# Altium footprint library THU.PcbLib: 477 footprints (part 17 of 30)
Each footprint in its own frame and in the unit in brackets; x right, y up, seen from the top. Pads: shape width x height; smd on the part's side, far side on the other; paste and mask are expansions set on the pad; w line width, h text height; cw(c..) or ccw(c..) is an arc to the next point about the centre after c.
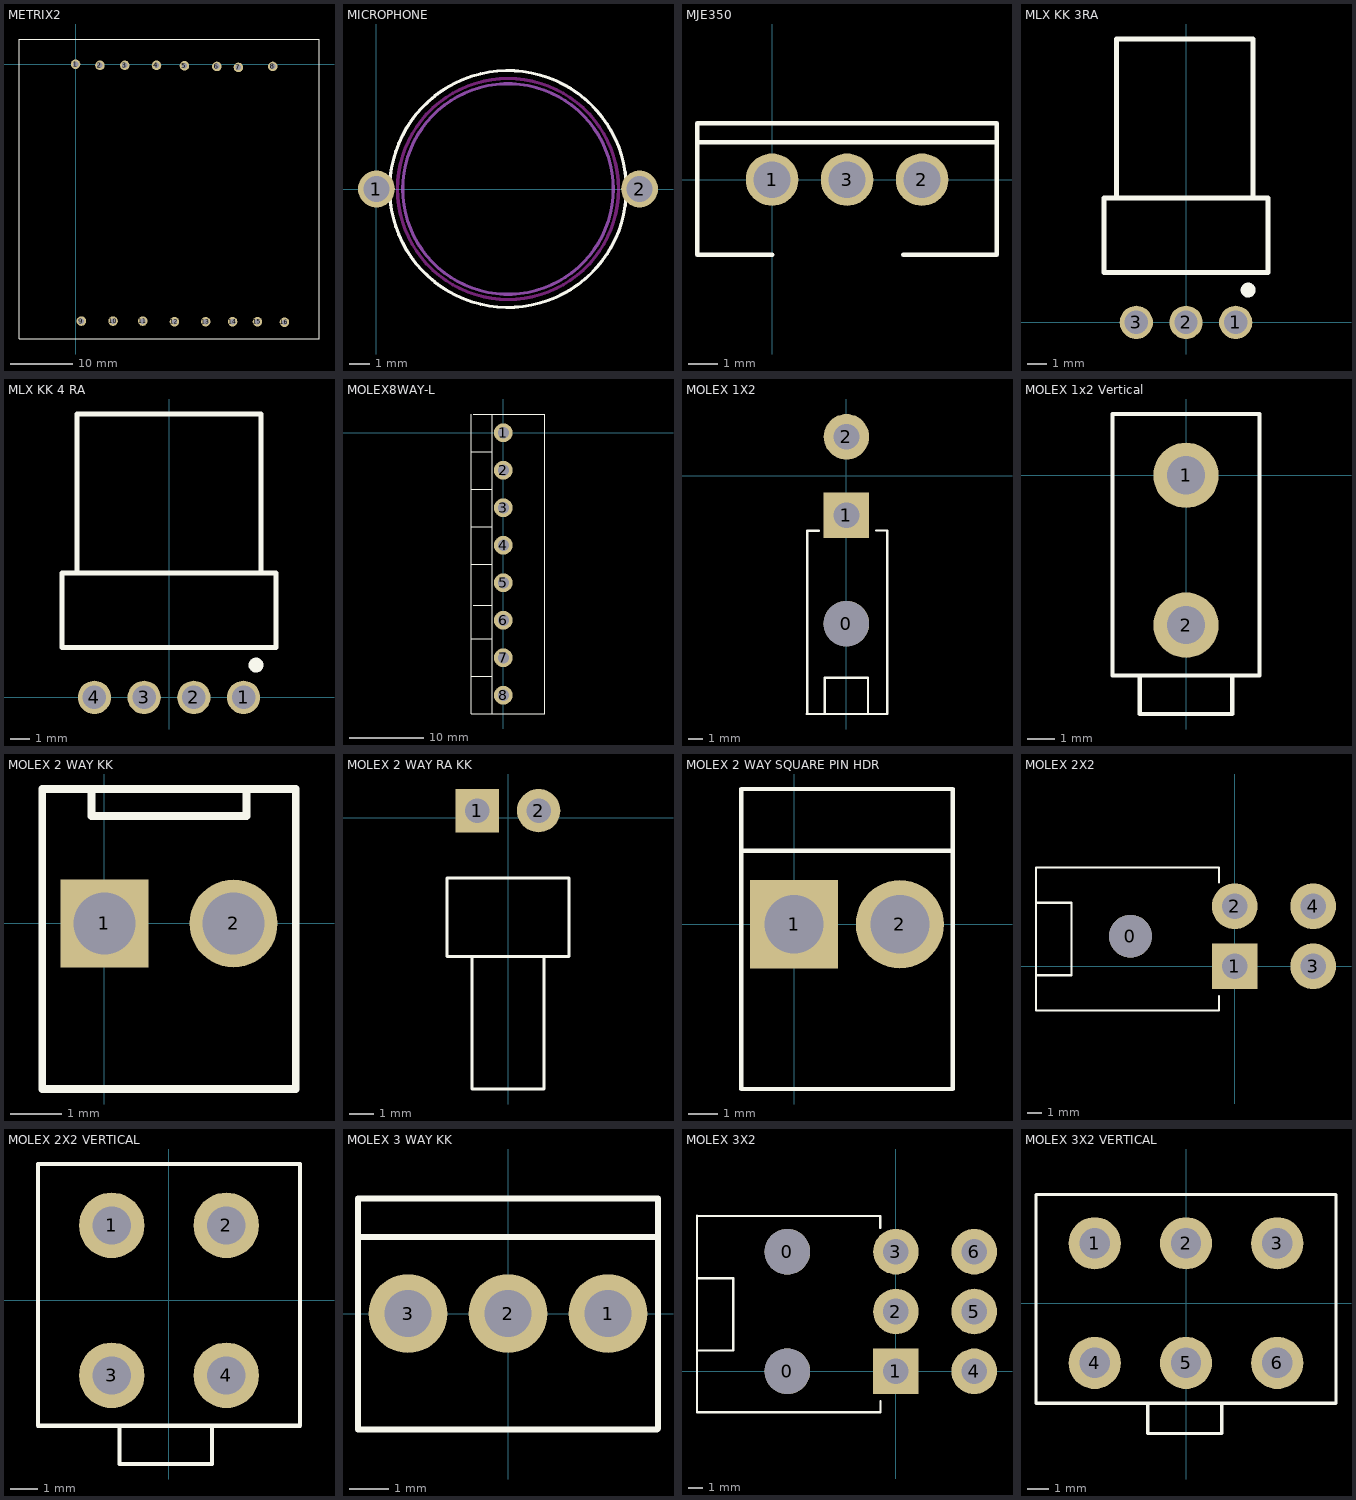
[diagram p16: the footprints below, top view; thin cyan lines are the x and y axes]

## METRIX2 [mil]
pads (16):
  round 60 hole 34: 1(0,0) 2(153.54,-6.89) 3(310.04,-6.89) 4(509.84,-6.89) 5(686.02,-9.84) 6(889.76,-13.78) 7(1025.59,-19.68) 8(1242.13,-13.78) 9(36.42,-1618.11) 10(236.22,-1618.11) 11(423.23,-1618.11) 12(623.03,-1622.05) 13(819.88,-1622.05) 14(989.17,-1622.05) 15(1145.67,-1622.05) 16(1315.94,-1625)
TopOverlay:
  lines w6: -356.3,-1729.33 1533.46,-1729.33 1533.46,157.48 -356.3,157.48 -356.3,-1729.33

## MICROPHONE [mil]
pads (2):
  round 70 hole 49: 1(0,0) 2(500,0)
TopOverlay:
  circle w6: c250,0 r225
KeepOutLayer:
  circle w6: c250,0 r210
Mechanical3:
  circle w6: c250,0 r200

## MJE350 [mil]
pads (3):
  round 70 hole 49: 1(0,0) 2(200,0) 3(100,0)
TopOverlay:
  lines w6: 0,-100 -100,-100 -100,50 ; 150,50 175,50 ; 175,-100 300,-100 300,50 ; -100,50 -100,75 300,75 300,50 ; -100,50 300,50

## MLX KK 3RA [mm]
pads (3):
  round 1.7 hole 1.2: 1(2.54,0) 2(0,0) 3(-2.54,0)
TopOverlay:
  circle w0.254: c3.175,1.651 r0.127
  circle w0.254: c3.175,1.651 r0.254
  lines w0.254: -3.556,6.35 -3.556,14.478 3.429,14.478 3.429,6.35 ; -4.191,2.54 4.191,2.54 4.191,6.35 -4.191,6.35 -4.191,2.54
3D body "022057038 3 PIN RA MOLEX.stp": height 5.87, standoff -3.77, extent -3.81,-0.307 3.81,14.431

## MLX KK 4 RA [mm]
pads (4):
  round 1.7 hole 1.2: 1(3.81,0) 2(1.27,0) 3(-1.27,0) 4(-3.81,0)
TopOverlay:
  circle w0.254: c4.445,1.651 r0.254
  circle w0.254: c4.445,1.651 r0.127
  lines w0.254: -4.699,6.35 -4.699,14.478 4.699,14.478 4.699,6.35 ; -5.461,2.54 -5.461,6.35 5.461,6.35 5.461,2.54 -5.461,2.54
3D body "022057048 4 PIN RA MOLEX.stp": height 5.87, standoff -3.77, extent -5.08,-0.307 5.08,14.431

## MOLEX8WAY-L [mil]
pads (8):
  round 100 hole 59: 1(0,0) 2(0,-200) 3(0,-400) 4(0,-600) 5(0,-800) 6(0,-1000) 7(0,-1200) 8(0,-1400)
TopOverlay:
  lines w6: -170,-1300 -60,-1300 ; -170,-1100 -60,-1100 ; -170,-500 -60,-500 ; -170,-300 -60,-300 ; -170,-100 -60,-100 ; -170,100 -170,-700 ; -160,-920 -60,-920 ; -160,100 220,100 220,-1500 -150,-1500 ; -120,-1500 -170,-1500 -170,-700 ; -60,-1500 -60,-700 ; -60,100 -60,-700 ; -170,-700 -60,-700

## MOLEX 1X2 [mm]
pads (3):
  round 3.2 hole 3.2: 0(0,-10.37)
  rect 3.2x3.2 hole 1.8: 1(0,-2.75)
  round 3.2 hole 1.8: 2(0,2.75)
TopOverlay:
  lines w0.152: -2.794,-16.72 2.87,-16.72 2.87,-3.842 2.083,-3.842 ; -2.76,-16.72 -2.754,-3.85 -1.939,-3.85 ; -1.524,-16.72 -1.524,-14.18 1.524,-14.18 1.524,-16.72
3D body "039301020.stp": height 11.4, standoff -3.6, extent -2.727,-16.658 3.073,3.277

## MOLEX 1x2 Vertical [mm] "Molex P/N: 39281023"
height 12.8
pads (2):
  round 2.4 hole 1.4: 1(0,0) 2(0,-5.5)
TopOverlay:
  lines w0.152: -1.7,-7.363 -1.7,-8.763 0,-8.763 1.7,-8.763 1.7,-7.363 ; 2.667,-7.35 -2.7,-7.35 -2.7,2.25 2.7,2.25 2.7,-7.35
3D body: height 12.8, standoff 0, extent -2.75,-7.5 2.75,2.25
3D body: height 12.8, standoff 9.7, extent -1.75,-8.75 1.75,-7.5

## MOLEX 2 WAY KK [mm]
pads (2):
  rect 1.7x1.7 hole 1.2: 1(0,0)
  round 1.7 hole 1.2: 2(2.5,0)
TopOverlay:
  lines w0.152: -0.25,2.575 -0.25,2.075 2.75,2.075 2.75,2.575 ; -1.2,-3.2 -1.2,0 -1.2,2.6 3.7,2.6 3.7,0 3.7,-3.2 -1.2,-3.2

## MOLEX 2 WAY RA KK [mm] "0022053021"
height 6.35
pads (2):
  rect 1.8x1.8 hole 1.02 unplated: 1(-1.27,0.3)
  round 1.8 hole 1.02 unplated: 2(1.27,0.3)
TopOverlay:
  lines w0.127: -1.5,-5.75 -1.5,-11.25 1.5,-11.25 1.5,-5.75 ; -2.54,-5.75 2.54,-5.75 2.54,-2.5 0,-2.5 -2.54,-2.5 -2.54,-5.75
3D body "022053021.stp": height 6.38, standoff -3.56, extent -2.464,-12.429 2.464,0.5

## MOLEX 2 WAY SQUARE PIN HDR [mm]
pads (2):
  rect 3x3 hole 2: 1(0,0)
  round 3 hole 2: 2(3.6,0)
TopOverlay:
  lines w0.152: -1.8,2.5 5.4,2.5 ; -1.8,-5.6 5.4,-5.6 5.4,0 5.4,4.6 -1.8,4.6 -1.8,0 -1.8,-5.6

## MOLEX 2X2 [mm]
pads (5):
  round 3 hole 3 unplated: 0(-7.3,2.1)
  rect 3.2x3.2 hole 1.8: 1(0,0)
  round 3.2 hole 1.8: 2(0,4.2) 3(5.5,0) 4(5.5,4.2)
TopOverlay:
  lines w0.152: -13.919,-0.635 -11.43,-0.635 -11.43,4.445 -13.919,4.445 ; -1.1,5.885 -1.1,6.906 -13.919,6.912 -13.919,-3.099 -1.092,-3.099 -1.092,-2.083
3D body "039301040.stp": height 11.45, standoff -3.55, extent -13.919,-3.092 6.016,6.908

## MOLEX 2X2 VERTICAL [mm] "P/N 39-28-1023"
height 12.8
pads (4):
  round 2.4 hole 1.4: 1(-2.1,2.75) 2(2.1,2.75) 3(-2.1,-2.75) 4(2.1,-2.75)
TopOverlay:
  lines w0.152: -1.818,-4.6 -1.818,-6 -0.118,-6 1.582,-6 1.582,-4.6 ; -4.8,-4.6 -4.8,5 4.8,5 4.8,-4.6 -4.8,-4.6
3D body "039281043.stp": height 12.8, standoff -3.5, extent -5.2,-6 5.2,5

## MOLEX 3 WAY KK [mm] "VERTICAL MOUNT"
pads (3):
  round 2 hole 1.19: 1(2.54,0) 2(0,0) 3(-2.54,0)
TopOverlay:
  lines w0.152: -3.79,1.94 3.81,1.94 ; 3.79,-2.94 -3.81,-2.94 -3.81,2.921 3.81,2.92 3.81,-2.92
3D body "022292031.stp": height 11.74, standoff -3.52, extent -3.81,-2.9 3.81,2.9

## MOLEX 3X2 [mm]
pads (8):
  round 3.2 hole 3.2: 0(-7.62,0) 0(-7.62,8.4)
  rect 3.2x3.2 hole 1.8: 1(0,0)
  round 3.2 hole 1.8: 2(0,4.2) 3(0,8.4) 4(5.5,0) 5(5.5,4.2) 6(5.5,8.4)
TopOverlay:
  lines w0.152: -13.97,1.457 -11.43,1.457 -11.43,6.537 -13.97,6.537 ; -13.97,10.906 -1.1,10.9 -1.1,10.085 ; -13.97,10.922 -13.97,-2.87 -1.092,-2.87 -1.092,-2.083
3D body "039301060.stp": height 11.4, standoff -3.6, extent -14.05,-3.1 5.885,11.1

## MOLEX 3X2 VERTICAL [mm]
pads (6):
  round 2.4 hole 1.4: 1(-4.2,2.75) 2(0,2.75) 3(4.2,2.75) 4(-4.2,-2.75) 5(0,-2.75) 6(4.2,-2.75)
TopOverlay:
  lines w0.152: -1.759,-4.6 -1.759,-6 -0.059,-6 1.641,-6 1.641,-4.6 ; -6.9,-4.6 6.9,-4.6 6.9,5 -6.9,5 -6.9,-4.6
3D body "039281063.stp": height 12.8, standoff -3.5, extent -7.3,-6.073 7.3,4.927